# Altium footprint library TYCO THD.PcbLib: 146 footprints (part 9 of 11)
Each footprint in its own frame and in the unit in brackets; x right, y up, seen from the top. Pads: shape width x height; smd on the part's side, far side on the other; paste and mask are expansions set on the pad; w line width, h text height; cw(c..) or ccw(c..) is an arc to the next point about the centre after c.
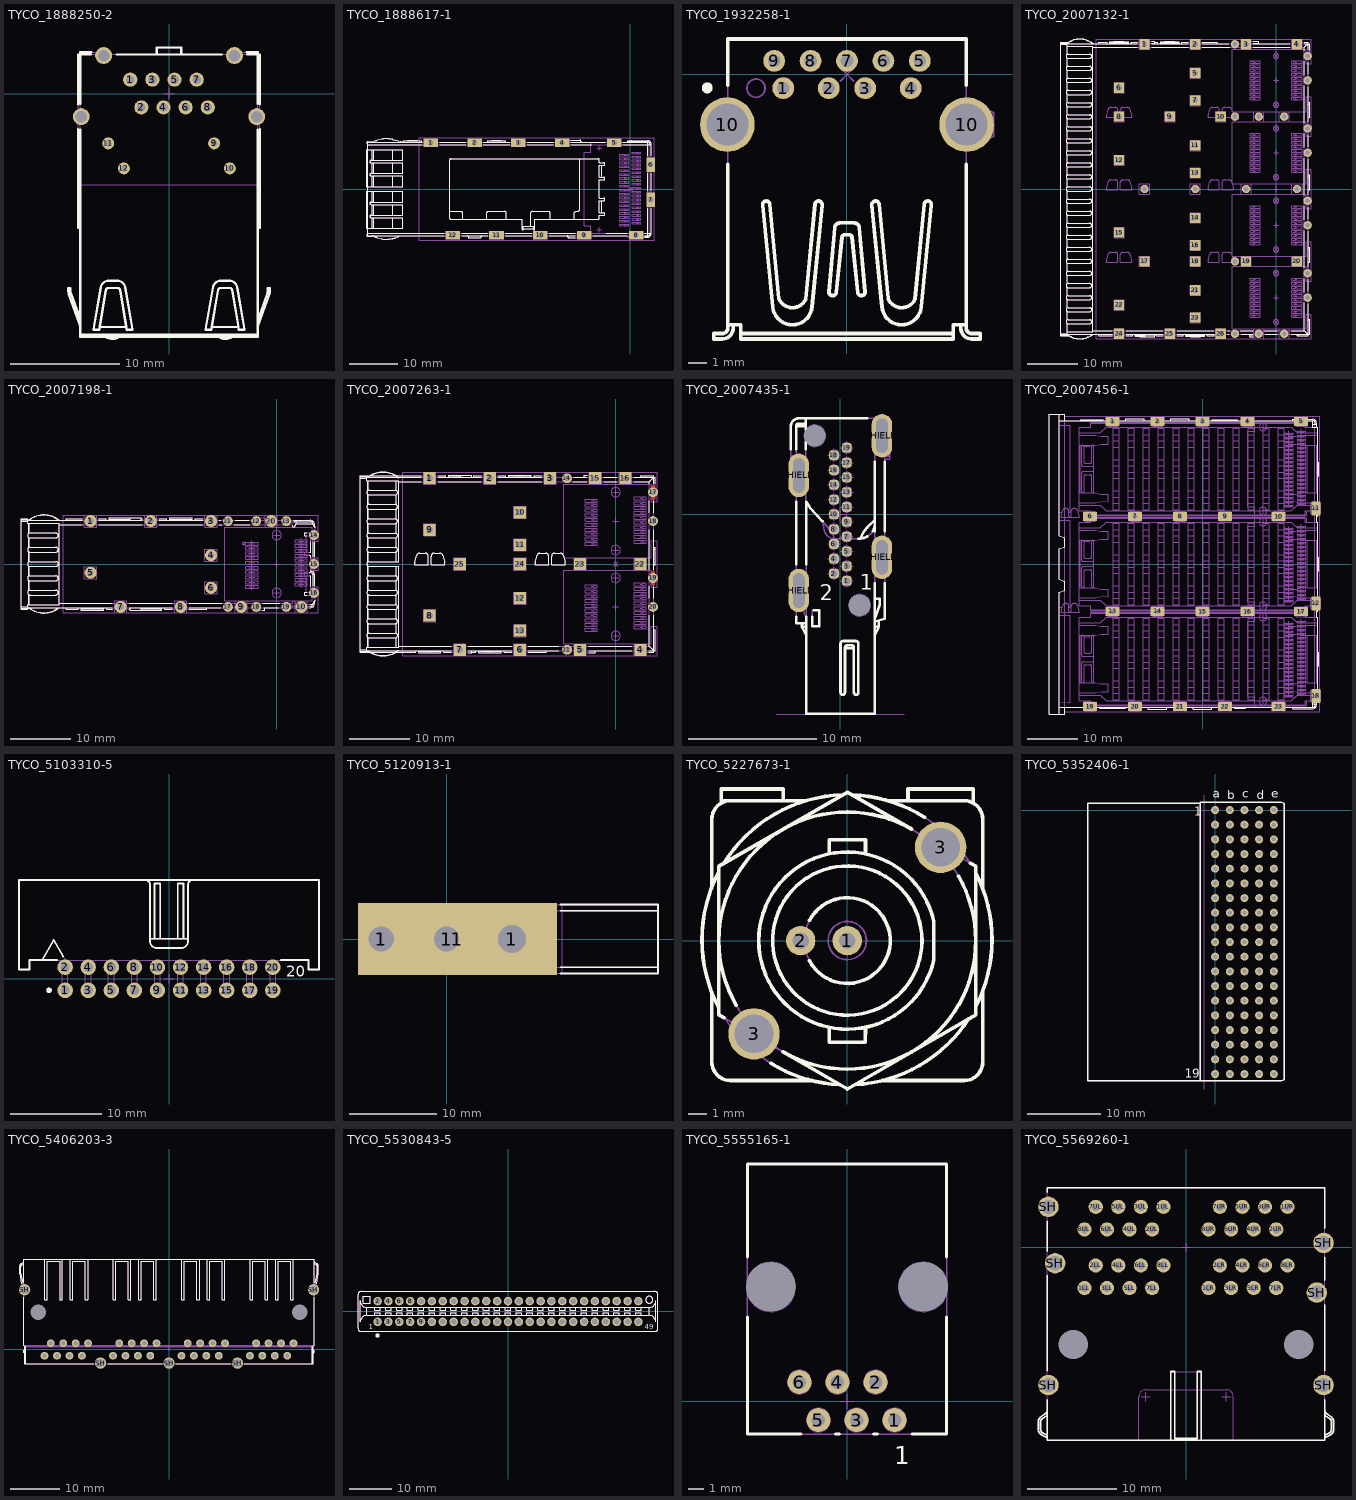
[diagram p8: the footprints below, top view; thin cyan lines are the x and y axes]

## TYCO_1888250-2 [mm] "1 Port, Bi-Color Yellow/Green LEDs, RJ45 10/100Base-T, Cat 5, Ethernet Connector Module"
height 7.38
pads (16):
  round 1.3 hole 0.8: 1(-3.556,1.27) 2(-2.54,-1.27) 3(-1.524,1.27) 4(-0.508,-1.27) 5(0.508,1.27) 6(1.524,-1.27) 7(2.54,1.27) 8(3.556,-1.27)
  round 1.1 hole 0.6: 9(4.14,-4.57) 10(5.58,-6.87) 11(-5.58,-4.57) 12(-4.14,-6.87)
  round 1.55 hole 1.05: SHIELD(-8.045,-2.12) SHIELD(-6,3.48) SHIELD(6,3.48) SHIELD(8.045,-2.12)
Top Overlay:
  lines w0.2: -8.345,-3.256 -8.345,-12.32 -8.145,-12.32 ; -8.345,-0.984 -8.345,3.58 -7.171,3.58 ; -8.145,-22.12 8.145,-22.12 ; -8.145,-20.703 -9.015,-18.311 cw(c-8.545,-18.14) -9.045,-18.14 -9.045,-17.84 -9.245,-17.84 -9.245,-18.14 ccw(c-8.545,-18.14) -9.203,-18.379 -8.19,-21.164 ; -8.145,-3.291 -8.145,-22.32 8.145,-22.32 8.145,-3.291 ; -8.145,-0.949 -8.145,3.78 -7.136,3.78 ; -5.841,-22.326 ccw(c-5.029,-20.72) -5.16,-22.515 ccw(c-5.291,-20.72) -4.47,-22.322 ; -4.829,3.58 4.829,3.58 ; -4.482,-18.052 ccw(c-4.729,-18.09) -4.729,-17.84 -5.551,-17.84 ccw(c-5.551,-18.09) -5.798,-18.052 -6.359,-21.42 ; -4.475,-18.051 -3.921,-21.42 ; -1.119,3.58 -1.119,4.22 1.125,4.22 1.125,3.58 ; 4.471,-22.322 ccw(c5.291,-20.72) 5.16,-22.515 ccw(c5.029,-20.72) 5.843,-22.325 ; 5.798,-18.052 ccw(c5.551,-18.09) 5.551,-17.84 4.729,-17.84 ccw(c4.729,-18.09) 4.482,-18.052 3.921,-21.42 ; 5.805,-18.051 6.359,-21.42 ; 7.136,3.78 8.145,3.78 8.145,-0.949 ; 7.171,3.58 8.345,3.58 8.345,-0.984 ; 8.145,-21.42 8.165,-21.303 9.205,-18.374 ccw(c8.545,-18.14) 9.245,-18.14 ; 8.145,-20.762 9.016,-18.307 ccw(c8.545,-18.14) 9.045,-18.14 9.045,-17.84 9.245,-17.84 9.245,-18.143 ; 8.145,-12.32 8.345,-12.32 8.345,-3.256 ; -8.19,-21.164 -8.145,-21.42 -8.19,-21.164 ; -6.359,-21.42 -3.921,-21.42 ; -6.359,-21.42 -6.39,-21.67 -6.938,-21.67 -6.257,-17.79 cw(c-5.519,-17.92) -5.519,-17.17 -4.761,-17.17 cw(c-4.761,-17.92) -4.023,-17.79 -3.342,-21.67 -3.89,-21.67 -3.921,-21.42 ; 3.921,-21.42 6.359,-21.42 ; 3.921,-21.42 3.89,-21.67 3.342,-21.67 4.023,-17.79 cw(c4.761,-17.92) 4.761,-17.17 5.519,-17.17 cw(c5.519,-17.92) 6.257,-17.79 6.938,-21.67 6.39,-21.67 6.359,-21.42
Mechanical 8:
  lines w0.1: -8.545,-2.12 -8.045,-2.12 ; -8.15,-8.37 8.15,-8.37 ; -8.045,-2.62 -8.045,-2.12 ; -8.045,-1.62 -8.045,-2.12 ; -7.545,-2.12 -8.045,-2.12 ; -6.5,3.48 -6,3.48 ; -6.08,-4.57 -5.58,-4.57 ; -6,2.98 -6,3.48 ; -6,3.98 -6,3.48 ; -5.58,-5.07 -5.58,-4.57 ; -5.58,-4.07 -5.58,-4.57 ; -5.5,3.48 -6,3.48 ; -5.08,-4.57 -5.58,-4.57 ; -4.64,-6.87 -4.14,-6.87 ; -4.14,-7.37 -4.14,-6.87 ; -4.14,-6.37 -4.14,-6.87 ; -4.056,1.27 -3.556,1.27 ; -3.64,-6.87 -4.14,-6.87 ; -3.556,0.77 -3.556,1.27 ; -3.556,1.77 -3.556,1.27 ; -3.056,1.27 -3.556,1.27 ; -3.04,-1.27 -2.54,-1.27 ; -2.54,-1.77 -2.54,-1.27 ; -2.54,-0.77 -2.54,-1.27 ; -2.04,-1.27 -2.54,-1.27 ; -2.024,1.27 -1.524,1.27 ; -1.524,0.77 -1.524,1.27 ; -1.524,1.77 -1.524,1.27 ; -1.024,1.27 -1.524,1.27 ; -1.008,-1.27 -0.508,-1.27 ; -0.508,-1.77 -0.508,-1.27 ; -0.508,-0.77 -0.508,-1.27 ; -0.5,0 0,0 ; -0.008,-1.27 -0.508,-1.27 ; 0,-0.5 0,0 ; 0,0.5 0,0 ; 0.008,1.27 0.508,1.27 ; 0.5,0 0,0 ; 0.508,0.77 0.508,1.27 ; 0.508,1.77 0.508,1.27 ; 1.008,1.27 0.508,1.27 ; 1.024,-1.27 1.524,-1.27 ; 1.524,-1.77 1.524,-1.27 ; 1.524,-0.77 1.524,-1.27 ; 2.024,-1.27 1.524,-1.27 ; 2.04,1.27 2.54,1.27 ; 2.54,0.77 2.54,1.27 ; 2.54,1.77 2.54,1.27 ; 3.04,1.27 2.54,1.27 ; 3.056,-1.27 3.556,-1.27 ; 3.556,-1.77 3.556,-1.27 ; 3.556,-0.77 3.556,-1.27 ; 3.64,-4.57 4.14,-4.57 ; 4.056,-1.27 3.556,-1.27 ; 4.14,-5.07 4.14,-4.57 ; 4.14,-4.07 4.14,-4.57 ; 4.64,-4.57 4.14,-4.57 ; 5.08,-6.87 5.58,-6.87 ; 5.5,3.48 6,3.48 ; 5.58,-7.37 5.58,-6.87 ; 5.58,-6.37 5.58,-6.87 ; 6,2.98 6,3.48 ; 6,3.98 6,3.48 ; 6.08,-6.87 5.58,-6.87 ; 6.5,3.48 6,3.48 ; 7.545,-2.12 8.045,-2.12 ; 8.045,-2.62 8.045,-2.12 ; 8.045,-1.62 8.045,-2.12 ; 8.545,-2.12 8.045,-2.12
Mechanical 14:
  lines w0.1: -8.145,-22.12 8.145,-22.12 ; -8.145,-20.703 -9.015,-18.311 cw(c-8.545,-18.14) -9.045,-18.14 -9.045,-17.84 -9.245,-17.84 -9.245,-18.14 ccw(c-8.545,-18.14) -9.203,-18.379 -8.19,-21.164 ; -8.145,-12.32 -8.345,-12.32 -8.345,3.58 8.345,3.58 8.345,-12.32 8.145,-12.32 ; -6.395,3.58 -6.395,3.78 -8.145,3.78 -8.145,-22.32 8.145,-22.32 8.145,3.78 6.395,3.78 6.395,3.58 ; -5.841,-22.326 ccw(c-5.029,-20.72) -5.16,-22.515 ccw(c-5.291,-20.72) -4.47,-22.322 ; -4.482,-18.052 ccw(c-4.729,-18.09) -4.729,-17.84 -5.551,-17.84 ccw(c-5.551,-18.09) -5.798,-18.052 -6.359,-21.42 ; -4.475,-18.051 -3.921,-21.42 ; -1.119,3.58 -1.119,4.22 1.125,4.22 1.125,3.58 ; 4.473,-22.323 ccw(c5.291,-20.72) 5.16,-22.515 ccw(c5.029,-20.72) 5.851,-22.321 ; 5.798,-18.052 ccw(c5.551,-18.09) 5.551,-17.84 4.729,-17.84 ccw(c4.729,-18.09) 4.482,-18.052 3.921,-21.42 ; 5.805,-18.051 6.359,-21.42 ; 8.145,-21.42 8.165,-21.303 9.205,-18.374 ccw(c8.545,-18.14) 9.245,-18.14 ; 8.145,-20.762 9.016,-18.307 ccw(c8.545,-18.14) 9.045,-18.14 9.045,-17.84 9.245,-17.84 9.245,-18.143 ; -8.19,-21.164 -8.145,-21.42 -8.19,-21.164 ; -6.359,-21.42 -3.921,-21.42 ; -6.359,-21.42 -6.39,-21.67 -6.938,-21.67 -6.257,-17.79 cw(c-5.519,-17.92) -5.519,-17.17 -4.761,-17.17 cw(c-4.761,-17.92) -4.023,-17.79 -3.342,-21.67 -3.89,-21.67 -3.921,-21.42 ; 3.921,-21.42 6.359,-21.42 ; 3.921,-21.42 3.89,-21.67 3.342,-21.67 4.023,-17.79 cw(c4.761,-17.92) 4.761,-17.17 5.519,-17.17 cw(c5.519,-17.92) 6.257,-17.79 6.938,-21.67 6.39,-21.67 6.359,-21.42
Drill Drawing:
  lines w0.1: -9.25,-8.355 -7.08,-8.355 9.245,-8.355 9.245,5 -9.25,5 -9.25,-8.355
  text "+0.05/-0.05" at -4.5,-13 h1
  text "Diameter Tolerance" at -6.5,-11.5 h1
  text "PRESS-FIT TECHNOLOGY" at -8.5,-10 h1
3D body "TYCO_1888250-2.stp": height 8.48, standoff -5.3, extent -9.245,-22.515 9.245,4.22

## TYCO_1888617-1 [mm] "QSFP Press Fit Cage"
height 9.7
pads (12):
  rect 3x1.75 hole 1.05: 1(-41.03,9.5) 2(-32.03,9.5) 3(-23.03,9.5) 4(-14.03,9.5) 5(-3.33,9.5) 8(1.17,-9.5) 9(-9.53,-9.5) 10(-18.53,-9.5) 11(-27.53,-9.5) 12(-36.53,-9.5)
  rect 1.75x3 hole 1.05: 6(4.17,5) 7(4.17,-2.2)
Top Overlay:
  drawing of 193 lines, arcs and shapes, not listed
Mechanical 8:
  drawing of 304 lines, arcs and shapes, not listed
Mechanical 14:
  drawing of 187 lines, arcs and shapes, not listed
Drill Drawing:
  lines w0.1: -36,-3.73 -15.355,-3.73 -10.15,-8.935 ; -43.43,-10.5 -43.43,10.5 4.875,10.5 4.875,-10.5 -43.43,-10.5
  text "12x diam. 1.05mm +/-0.05" at -36.1,-3.305 h1
  text "PRESS-FIT TECHNOLOGY" at -34.125,-1.92 h1
3D body "TYCO_1888617-1.stp": height 10.42, standoff -2.05, extent -54.23,-10.295 4.27,10.35

## TYCO_1932258-1 [mm] "9 Positions, USB 3.0 Type A Right Angle Receptacle"
height 6.99
pads (11):
  round 1.2 hole 0.7: 1(-3.5,-0.75) 2(-1,-0.75) 3(1,-0.75) 4(3.5,-0.75) 5(4,0.75) 6(2,0.75) 7(0,0.75) 8(-2,0.75) 9(-4,0.75)
  round 3 hole 2.3: 10(-6.57,-2.75) 10(6.57,-2.75)
Top Overlay:
  circle w0.3: c-7.677,-0.736 r0.15
  lines w0.2: -6.55,-13.75 -5.83,-13.75 -5.83,-14.53 5.83,-14.53 5.83,-13.75 6.55,-13.75 ; -6.55,-4.925 -6.55,-13.93 cw(c-6.85,-13.93) -6.85,-14.23 -7.315,-14.23 -7.315,-14.53 -6.85,-14.53 ccw(c-6.85,-13.93) -6.25,-13.93 -6.25,-13.75 ; -6.55,-0.575 -6.55,1.95 6.55,1.95 6.55,-0.575 ; -5.83,-14.23 5.742,-14.23 ; -1.365,-7.17 -1.922,-12.774 cw(c-3,-12.667) -4.078,-12.774 -4.635,-7.17 cw(c-4.436,-7.15) -4.237,-7.132 -3.742,-12.315 ccw(c-2.996,-12) -2.263,-12.346 -1.759,-7.114 cw(c-1.563,-7.149) -1.365,-7.169 ; -0.992,-11.931 ccw(c-0.791,-11.948) -0.591,-11.969 ; -0.992,-11.931 -0.681,-8.423 cw(c-0.382,-8.45) -0.382,-8.15 0.382,-8.15 cw(c0.382,-8.45) 0.681,-8.423 0.992,-11.931 ; -0.592,-11.969 -0.273,-8.931 cw(c-0.094,-8.986) -0.074,-8.8 0.074,-8.8 cw(c0.094,-8.986) 0.273,-8.931 0.592,-11.969 ; 0.591,-11.969 ccw(c0.791,-11.948) 0.992,-11.931 ; 4.635,-7.17 4.078,-12.774 cw(c3,-12.667) 1.922,-12.774 1.365,-7.17 cw(c1.564,-7.15) 1.763,-7.132 2.258,-12.315 ccw(c3.004,-12) 3.737,-12.346 4.241,-7.114 cw(c4.437,-7.149) 4.635,-7.169 ; 6.25,-13.75 6.25,-13.93 ccw(c6.85,-13.93) 6.85,-14.53 7.315,-14.53 7.315,-14.23 6.85,-14.23 cw(c6.85,-13.93) 6.55,-13.93 6.55,-4.925
Mechanical 8:
  lines w0.1: -7.07,-2.75 -6.57,-2.75 ; -6.57,-3.25 -6.57,-2.75 ; -6.57,-2.25 -6.57,-2.75 ; -6.07,-2.75 -6.57,-2.75 ; -4.5,0.75 -4,0.75 ; -4,-0.75 -3.5,-0.75 ; -4,0.25 -4,0.75 ; -4,1.25 -4,0.75 ; -3.5,-1.25 -3.5,-0.75 ; -3.5,-0.25 -3.5,-0.75 ; -3.5,0.75 -4,0.75 ; -3,-0.75 -3.5,-0.75 ; -2.5,0.75 -2,0.75 ; -2,0.25 -2,0.75 ; -2,1.25 -2,0.75 ; -1.5,-0.75 -1,-0.75 ; -1.5,0.75 -2,0.75 ; -1,-1.25 -1,-0.75 ; -1,-0.25 -1,-0.75 ; -0.5,-0.75 -1,-0.75 ; -0.5,0.75 0,0.75 ; -0.354,-0.354 0,0 ; -0.354,0.354 0,0 ; 0,0.25 0,0.75 ; 0,1.25 0,0.75 ; 0.354,-0.354 0,0 ; 0.354,0.354 0,0 ; 0.5,-0.75 1,-0.75 ; 0.5,0.75 0,0.75 ; 1,-1.25 1,-0.75 ; 1,-0.25 1,-0.75 ; 1.5,-0.75 1,-0.75 ; 1.5,0.75 2,0.75 ; 2,0.25 2,0.75 ; 2,1.25 2,0.75 ; 2.5,0.75 2,0.75 ; 3,-0.75 3.5,-0.75 ; 3.5,-1.25 3.5,-0.75 ; 3.5,-0.25 3.5,-0.75 ; 3.5,0.75 4,0.75 ; 4,-0.75 3.5,-0.75 ; 4,0.25 4,0.75 ; 4,1.25 4,0.75 ; 4.5,0.75 4,0.75 ; 6.07,-2.75 6.57,-2.75 ; 6.57,-3.25 6.57,-2.75 ; 6.57,-2.25 6.57,-2.75 ; 7.07,-2.75 6.57,-2.75
Mechanical 14:
  circle w0.1: c-5,-0.75 r0.5
  lines w0.1: -6.782,-3.641 -6.55,-3.719 ; -6.782,-1.859 -6.55,-1.781 ; -6.55,-13.75 -5.83,-13.75 -5.83,-14.53 5.83,-14.53 5.83,-13.75 6.55,-13.75 ; -6.25,-13.75 -6.25,-13.93 cw(c-6.85,-13.93) -6.85,-14.53 -7.315,-14.53 -7.315,-14.23 -6.85,-14.23 ccw(c-6.85,-13.93) -6.55,-13.93 -6.55,1.95 6.55,1.95 6.55,-13.93 ccw(c6.85,-13.93) 6.85,-14.23 7.315,-14.23 7.315,-14.53 6.85,-14.53 cw(c6.85,-13.93) 6.25,-13.93 6.25,-13.75 ; -5.83,-14.23 5.742,-14.23 ; -1.365,-7.17 -1.922,-12.774 cw(c-3,-12.667) -4.078,-12.774 -4.635,-7.17 cw(c-4.436,-7.15) -4.237,-7.132 -3.742,-12.315 ccw(c-2.996,-12) -2.263,-12.346 -1.759,-7.114 cw(c-1.563,-7.149) -1.365,-7.169 ; -0.992,-11.931 ccw(c-0.791,-11.948) -0.591,-11.969 ; -0.992,-11.931 -0.681,-8.423 cw(c-0.382,-8.45) -0.382,-8.15 0.382,-8.15 cw(c0.382,-8.45) 0.681,-8.423 0.992,-11.931 ; -0.592,-11.969 -0.273,-8.931 cw(c-0.094,-8.986) -0.074,-8.8 0.074,-8.8 cw(c0.094,-8.986) 0.273,-8.931 0.592,-11.969 ; 0.591,-11.969 ccw(c0.791,-11.948) 0.992,-11.931 ; 4.635,-7.17 4.078,-12.774 cw(c3,-12.667) 1.922,-12.774 1.365,-7.17 cw(c1.564,-7.15) 1.763,-7.132 2.258,-12.315 ccw(c3.004,-12) 3.737,-12.346 4.241,-7.114 cw(c4.437,-7.149) 4.635,-7.169 ; 6.55,-3.719 6.782,-3.641 7.826,-3.493 8.05,-3.417 8.05,-2.083 7.826,-2.007 6.782,-1.859 6.55,-1.781
3D body "TYCO_1932258-1.stp": height 7.76, standoff -3.7, extent -8.046,-14.53 8.047,1.95

## TYCO_2007132-1 [mm] "SFP+ 1x4 Press Fit Cage"
height 8.8
pads (46):
  rect 2x2 hole 1.05: 1(-25.9,28.5) 2(-15.9,28.5) 3(-5.9,28.5) 4(4.1,28.5) 5(-15.9,22.825) 6(-30.9,19.925) 7(-15.9,17.425) 8(-30.9,14.25) 9(-20.9,14.25) 10(-10.9,14.25) 11(-15.9,8.575) 12(-30.9,5.675) 13(-15.9,3.175) 14(-15.9,-5.675) 15(-30.9,-8.575) 16(-15.9,-11.075) 17(-25.9,-14.25) 18(-15.9,-14.25) 19(-5.9,-14.25) 20(4.1,-14.25) 21(-15.9,-19.925) 22(-30.9,-22.825) 23(-15.9,-25.325) 24(-30.9,-28.5) 25(-20.9,-28.5) 26(-10.9,-28.5)
  round 1.65 hole 0.95: 27(-8.1,28.5) 28(6.2,26.175) 29(6.2,21.375) 30(-8.1,14.25) 31(-3.4,14.25) 32(1.6,14.25) 33(6.2,11.925) 34(6.2,7.125) 35(-25.9,0) 36(-15.9,0) 37(-5.9,0) 38(4.1,0) 39(6.2,-2.325) 40(6.2,-7.125) 41(-8.1,-14.25) 42(6.2,-16.575) 43(6.2,-21.375) 44(-8.1,-28.5) 45(-3.4,-28.5) 46(1.6,-28.5)
Top Overlay:
  drawing of 1962 lines, arcs and shapes, not listed
Mechanical 8:
  drawing of 903 lines, arcs and shapes, not listed
Mechanical 14:
  drawing of 2036 lines, arcs and shapes, not listed
Drill Drawing:
  lines w0.1: -22.255,-23.6 -22.255,-2.955 -17.05,2.25 ; -19.9,-23.6 -19.9,-3.7 -17,-0.8 ; -35.4,-29.5 7.3,-29.5 7.3,29.5 -35.4,29.5 -35.4,-29.5
  text "20x diam. 0.95mm +/-0.05" at -20.6,-23.6 h1
  text "26x diam. 1.05mm +/-0.05" at -22.68,-23.7 h1
  text "PRESS-FIT TECHNOLOGY" at -18.255,-20.9 h1
3D body "TYCO_2007132-1.stp": height 10.59, standoff -2.05, extent -42.4,-29.525 6.575,29.525

## TYCO_2007198-1 [mm] "SFP+ 1x1 Press Fit Cage"
height 9.7
pads (20):
  round 2 hole 1.05: 1(-30.9,7.125) 2(-20.9,7.125) 3(-10.9,7.125) 4(-10.9,1.445) 5(-30.9,-1.455) 6(-10.9,-3.955) 7(-25.9,-7.125) 8(-15.9,-7.125) 9(-5.9,-7.125) 10(4.1,-7.125)
  round 1.65 hole 0.95: 11(-8.1,7.125) 12(-3.4,7.125) 13(1.6,7.125) 14(6.2,4.8) 15(6.2,0) 16(6.2,-4.8) 17(-8.1,-7.125) 18(-3.4,-7.125) 19(1.6,-7.125)
  round 2 hole 0.85: 20(-0.9,7.125)
Top Overlay:
  drawing of 194 lines, arcs and shapes, not listed
Mechanical 8:
  drawing of 301 lines, arcs and shapes, not listed
Mechanical 14:
  drawing of 208 lines, arcs and shapes, not listed
Drill Drawing:
  lines w0.1: -32.1,-0.2 -11.7,-0.2 -8.1,-3.8 -8.1,-6.125 ; -32.1,2.2 -11.7,2.2 -11.4,1.9 ; -32,4.1 -11.7,4.1 -10.8,5 -3.025,5 -1.9,6.125 ; -32.6,-8.125 6.9,-8.125 6.9,8.125 -32.6,8.125 -32.6,-8.125
  text "1x diam. 0.85mm +/-0.05" at -31.4,4.5 h1
  text "9x diam. 0.95mm +/-0.05" at -31.6,0.4 h1
  text "10x diam. 1.05mm +/-0.05" at -32.2,2.625 h1
  text "PRESS-FIT TECHNOLOGY" at -29.4,-1.8 h1
3D body "TYCO_2007198-1.stp": height 10.6, standoff -3, extent -42.4,-8.145 6.4,8.145

## TYCO_2007263-1 [mm] "SFP+ 1x2 Press Fit Cage with EMI Springs"
height 9.7
pads (25):
  rect 2x2 hole 1.05: 1(-30.9,14.25) 2(-20.9,14.25) 3(-10.9,14.25) 4(4.1,-14.25) 5(-5.9,-14.25) 6(-15.9,-14.25) 7(-25.9,-14.25) 8(-30.9,-8.575) 9(-30.9,5.675) 10(-15.9,8.575) 11(-15.9,3.175) 12(-15.9,-5.675) 13(-15.9,-11.075)
  round 1.65 hole 0.95: 14(-8.1,14.25) 17(6.2,11.925) 18(6.2,7.125) 19(6.2,-2.325) 20(6.2,-7.125) 21(-8.1,-14.25)
  rect 2x2 hole 0.95: 15(-3.4,14.25) 16(1.6,14.25) 22(4.1,0) 23(-5.9,0) 24(-15.9,0) 25(-25.9,0)
Top Layer:
  region: 5.9,13.07 6.5,13.07 6.5,10.77 5.9,10.77
  region: 5.9,-1.18 6.5,-1.18 6.5,-3.48 5.9,-3.48
Top Overlay:
  drawing of 256 lines, arcs and shapes, not listed
Mechanical 8:
  drawing of 491 lines, arcs and shapes, not listed
  text "1" at -2.8,10.775 h1
  text "10" at -2.8,3.925 h1
  text "11" at 1.8,4.225 h1
  text "20" at 1.8,11.613 h1
  text "1" at -2.8,-3.475 h1
  text "10" at -2.8,-10.325 h1
  text "11" at 1.8,-10.025 h1
  text "20" at 1.8,-2.637 h1
  text "Component and Trace Keep-Out / Except Cage Chassis Ground" at -31.6,-13.5 h1
Mechanical 14:
  drawing of 239 lines, arcs and shapes, not listed
Drill Drawing:
  lines w0.1: -29.5,-3.4 -9.3,-3.4 -5.9,0 ; -29.4,-9.4 -10.75,-9.4 -5.9,-14.25 ; -31.9,-15.25 6.9,-15.25 6.9,15.25 -31.9,15.25 -31.9,-15.25
  text "PRESS-FIT" at -26.4,-5.1 h1
  text "13x diam. 1.05mm +/-0.05" at -29.2,-8.7 h1
  text "12x diam. 0.95mm +/-0.05" at -29.4,-2.8 h1
  text "TECHNOLOGY" at -27.2,-7 h1
3D body "TYCO_2007263-1.stp": height 10.6, standoff -2.05, extent -42.4,-15.273 6.575,15.273

## TYCO_2007435-1 [mm] "0.578mm Pitch, Through-Hole Right Angle 19 Contacts Flag-HDMI Type-A Receptacle Thru Hole Mounting Pads"
height 16.4
pads (25):
  rrect50% 0.75x0.75 hole 0.55: 1(0.5,-5.202) 2(-0.5,-4.624) 3(0.5,-4.046) 4(-0.5,-3.468) 5(0.5,-2.89) 6(-0.5,-2.312) 7(0.5,-1.734) 8(-0.5,-1.156) 9(0.5,-0.578) 10(-0.5,0) 11(0.5,0.578) 12(-0.5,1.156) 13(0.5,1.734) 14(-0.5,2.312) 15(0.5,2.89) 16(-0.5,3.468) 17(0.5,4.046) 18(-0.5,4.624) 19(0.5,5.202)
  round 0.5 hole 1.7 unplated mask+0.6: H1(-2,6.148) H2(1.5,-7.102)
  oval 1.6x3.4 hole 0.9 slot 2.7 at 90 deg: SHIELD(-3.25,-5.952) SHIELD(-3.25,3.048) SHIELD(3.25,-3.352) SHIELD(3.25,6.148)
Top Overlay:
  lines w0.2: -3.87,5.098 -3.87,6.903 cw(c-3.27,6.903) -3.27,7.503 2.1,7.503 ; -3.45,-8.002 -3.45,-8.497 -2.675,-8.497 ; -3.45,-3.902 -3.45,0.998 ; -3.45,5.098 -3.45,6.903 ; -3,-8.497 -3,-8.797 -2.675,-8.797 ; -2.986,-8.797 ccw(c-2.5,-8.679) -2.947,-8.903 -2.675,-9.447 ; -2.7,5.098 -2.7,5.666 ; -2.7,6.63 -2.7,7.503 ; -2.7,6.903 -3.45,6.903 ; -2.7,7.103 -3.27,7.103 ccw(c-3.251,6.905) -3.45,6.903 ; -2.675,-8.002 -2.675,-15.597 2.675,-15.597 2.675,-5.402 ; -2.675,-3.902 -2.675,0.998 ; -2.674,0.998 ccw(c1.227,3.123) -2.345,0.483 -1.4,-0.546 ; -2.214,-8.002 -2.214,-8.746 -1.662,-8.747 ; -2.1,-7.497 -1.662,-7.497 -1.662,-8.747 ; 0.36,-10.627 cw(c0.549,-10.635) 0.558,-10.446 ; 0.36,-10.42 0.36,-13.922 cw(c0.185,-13.922) 0.01,-13.922 0.01,-10.097 cw(c0.21,-10.097) 0.21,-9.897 1.21,-9.897 cw(c1.21,-10.097) 1.41,-10.097 1.41,-13.922 cw(c1.235,-13.922) 1.06,-13.922 1.06,-10.42 ccw(c0.873,-10.428) 0.86,-10.242 0.56,-10.242 ccw(c0.549,-10.431) 0.36,-10.416 ; 0.56,-10.446 0.86,-10.446 cw(c0.872,-10.633) 1.06,-10.627 ; 1.4,-1.897 1.55,-1.897 ; 2.1,-1.728 cw(c1.475,-0.674) 1.55,-1.897 ; 2.527,-1.302 ccw(c1.475,-0.674) 2.7,-0.702 2.7,4.098 ; 2.675,-9.447 2.947,-8.903 ccw(c2.5,-8.679) 2.986,-8.797 ; 2.675,-8.797 3,-8.797 3,-8.306 ; 2.675,-8.408 3.45,-8.165 3.45,-5.402 ; 2.675,-8.167 3.075,-7.067 3.075,-6.597 2.675,-6.597 ; 2.675,-1.302 2.675,-0.922 ; 2.7,-0.419 2.095,-1.031 ccw(c3.931,-2.79) 1.55,-1.897 ; 3.45,-1.302 3.45,4.098 ; -1.662,-8.747 -1.662,-8.747
  text "1" at 1.5,-5.9 h1.2
  text "2" at -1.6,-6.7 h1.2
Mechanical 8:
  drawing of 161 lines, arcs and shapes, not listed
  text "Interior Side Of Back Panel" at -4.7,-16.4 h0.5
Mechanical 14:
  lines w0.1: -3.87,4.543 -3.45,4.543 ; -3.45,-6.697 -3.94,-6.697 -3.94,-5.197 -3.45,-5.197 ; -3.45,4.293 -3.87,4.293 -3.87,6.903 cw(c-3.27,6.903) -3.27,7.503 3.27,7.503 cw(c3.27,6.903) 3.87,6.903 3.87,4.293 3.45,4.293 ; -3,-8.497 -3,-8.797 -2.675,-8.797 ; -2.986,-8.797 ccw(c-2.5,-8.679) -2.947,-8.903 -2.675,-9.447 ; -2.7,6.903 -3.45,6.903 ; -2.7,7.103 -3.27,7.103 ccw(c-3.251,6.905) -3.45,6.903 ; -2.7,7.503 -2.7,1.047 ccw(c1.227,3.123) -2.345,0.483 -0.955,-1.031 cw(c-2.876,-2.73) -0.451,-1.896 cw(c-0.409,-0.997) -1.267,-1.268 -1.379,-0.569 ; -2.675,-8.497 -3.45,-8.497 -3.45,6.903 ; -2.675,-8.167 -3.075,-7.067 -3.075,-6.597 -2.675,-6.597 ; -2.675,1 -2.675,-15.597 2.675,-15.597 2.675,-0.997 ; -0.45,-1.897 1.55,-1.897 ; 0.36,-10.627 cw(c0.549,-10.635) 0.558,-10.446 ; 0.36,-10.42 0.36,-13.922 cw(c0.185,-13.922) 0.01,-13.922 0.01,-10.097 cw(c0.21,-10.097) 0.21,-9.897 1.21,-9.897 cw(c1.21,-10.097) 1.41,-10.097 1.41,-13.922 cw(c1.235,-13.922) 1.06,-13.922 1.06,-10.42 ccw(c0.873,-10.428) 0.86,-10.242 0.56,-10.242 ccw(c0.549,-10.431) 0.36,-10.416 ; 0.56,-10.446 0.86,-10.446 cw(c0.872,-10.633) 1.06,-10.627 ; 2.675,-9.447 2.947,-8.903 ccw(c2.5,-8.679) 2.986,-8.797 ; 2.675,-8.797 3,-8.797 3,-8.306 ; 2.675,-8.408 3.45,-8.165 3.45,6.903 ; 2.675,-8.167 3.075,-7.067 3.075,-6.597 2.675,-6.597 ; 2.7,-0.419 2.095,-1.031 ccw(c3.931,-2.79) 1.55,-1.897 ; 2.7,6.903 3.45,6.903 ; 2.7,7.103 3.27,7.103 cw(c3.261,6.914) 3.45,6.903 ; 2.7,7.503 2.7,-0.702 cw(c1.475,-0.674) 1.55,-1.897 ; 3.45,-4.097 3.94,-4.097 3.94,-2.597 3.45,-2.597 ; 3.45,4.543 3.87,4.543 ; -1.662,-8.747 -2.215,-8.747 -2.214,-7.497 -1.662,-7.497 -1.662,-8.747 ; -1.662,-8.747 -1.662,-8.747
  text "1" at 1.5,-5.9 h1.2
  text "2" at -1.6,-6.7 h1.2
3D body "TYCO_2007435-1.stp": height 16.43, standoff -3.72, extent -3.94,-15.597 3.94,7.503
